# Altium footprint library aiskylab-01Resistors.PcbLib: 208 footprints (part 2 of 13)
Each footprint in its own frame and in the unit in brackets; x right, y up, seen from the top. Pads: shape width x height; smd on the part's side, far side on the other; paste and mask are expansions set on the pad; w line width, h text height; cw(c..) or ccw(c..) is an arc to the next point about the centre after c.
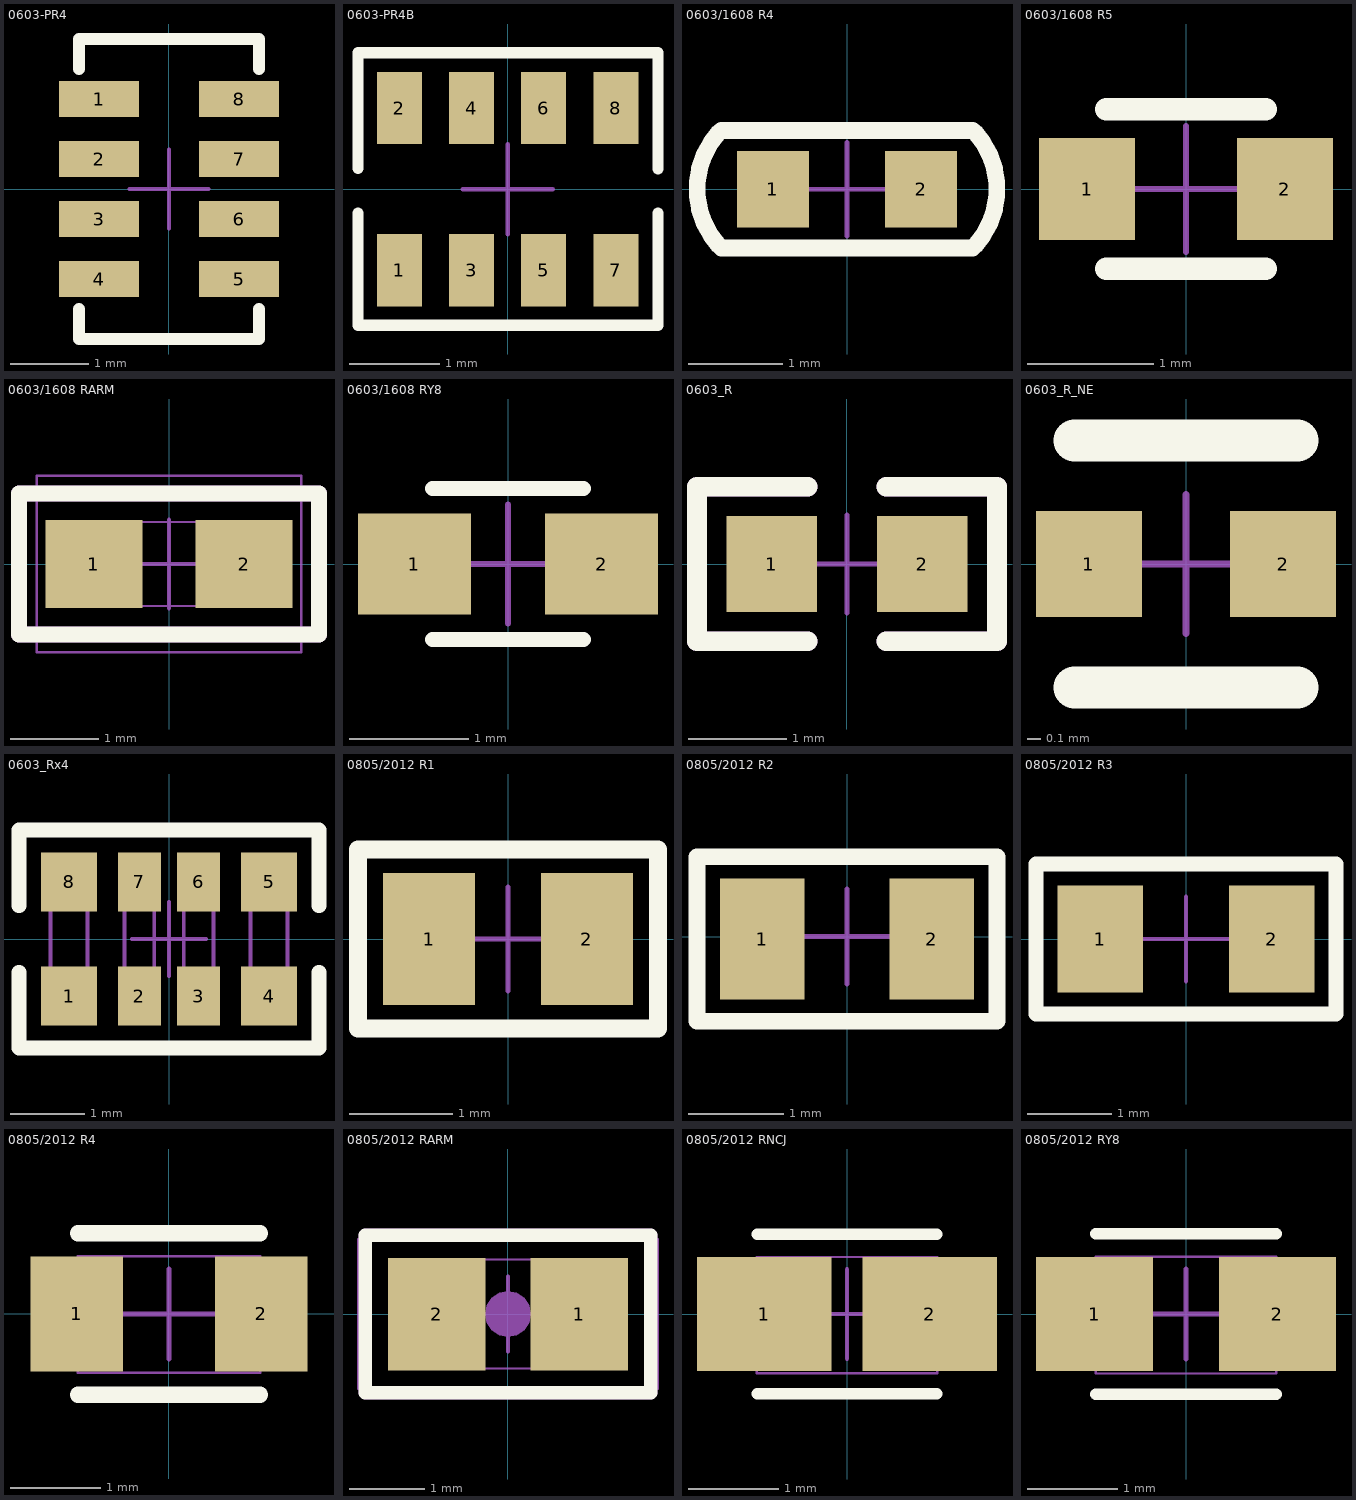
[diagram p1: the footprints below, top view; thin cyan lines are the x and y axes]

## 0603-PR4 [mil]
height 649.61
pads (8):
  rect 40x18 smd mask+2.76: 1(-35,45) 2(-35,15) 3(-35,-15) 5(35,-45) 6(35,-15) 7(35,15) 8(35,45)
  rect 40x18 smd: 4(-35,-45)
Top Overlay:
  lines w6: -45,-60 -45,-75 45,-75 45,-60 ; -45,60 -45,75 45,75 45,60
Top Designator:
  text ".Designator" at -300.52,-19.99 h60
Top Component Center:
  lines w1.97: -19.68,0 19.68,0 ; 0,-19.68 0,19.68
3D body "0_4572-1_016.stp": height 0.79, standoff 0, extent 15.01,36.01 55.01,54.01
3D body "0_4572-1_016.stp": height 0.79, standoff 0, extent 15.01,6.01 55.01,24
3D body "0_4572-1_016.stp": height 0.79, standoff 0, extent 15,-23.99 55,-5.99
3D body "0_4572-1_016.stp": height 0.79, standoff 0, extent 15.01,-53.99 55.01,-36
3D body "cay16-j2.stp": height 20.28, standoff 0, extent -31.49,-63 31.5,62.99
3D body "0_4572-1_016.stp": height 0.79, standoff 0, extent -54.99,-53.99 -14.99,-35.99
3D body "0_4572-1_016.stp": height 0.79, standoff 0, extent -54.99,-23.99 -14.99,-6
3D body "0_4572-1_016.stp": height 0.79, standoff 0, extent -54.99,6.01 -14.99,24
3D body "0_4572-1_016.stp": height 0.79, standoff 0, extent -55,36.01 -15,54.01

## 0603-PR4B [mm]
height 16.5
pads (8):
  rect 0.5x0.8 smd: 1(-1.2,-0.9) 2(-1.2,0.9) 3(-0.4,-0.9) 4(-0.4,0.9) 5(0.4,-0.9) 6(0.4,0.9) 7(1.2,-0.9) 8(1.2,0.9)
Top Overlay:
  lines w0.127: -1.66,-0.265 -1.66,-1.51 1.668,-1.51 1.668,-0.265 ; -1.66,0.232 -1.66,1.513 1.668,1.513 1.668,0.224
Top Designator:
  text ".Designator" at -7.613,-0.506 h1.52
Top Component Center:
  lines w0.05: -0.5,0 0.5,0 ; 0,-0.5 0,0.5
3D body "p080-050.stp": height 0.02, standoff 0, extent 0.95,-1.3 1.45,-0.5
3D body "p080-050.stp": height 0.02, standoff 0, extent 0.15,-1.3 0.65,-0.5
3D body "p080-050.stp": height 0.02, standoff 0, extent -0.65,-1.3 -0.15,-0.5
3D body "p080-050.stp": height 0.02, standoff 0, extent -1.45,-1.3 -0.95,-0.5
3D body "p080-050.stp": height 0.02, standoff 0, extent 0.95,0.5 1.45,1.3
3D body "p080-050.stp": height 0.02, standoff 0, extent 0.15,0.5 0.65,1.3
3D body "p080-050.stp": height 0.02, standoff 0, extent -0.65,0.5 -0.15,1.3
3D body "p080-050.stp": height 0.02, standoff 0, extent -1.45,0.5 -0.95,1.3
3D body "cay16-j2.stp": height 0.52, standoff 0, extent -1.6,-0.8 1.6,0.8

## 0603/1608 R4 [mil]
height 649.61
pads (2):
  rect 30x32 smd: 1(-31,0)
  rect 30x32 smd mask+2.76: 2(31,0)
Top Overlay:
  lines w7: -52.5,-24.61 52.5,-24.61 ; -52.5,24.61 52.5,24.61
  lines w7.01: -53.51,-23.77 cw(c-27.44,0.11) -53.51,24 ; 53.5,-23.77 ccw(c27.43,0.11) 53.5,24
Top Designator:
  text ".Designator" at -299.91,-19.99 h60
Top Component Center:
  lines w1.97: -19.68,0 19.68,0 ; 0,-19.68 0,19.68
3D body "0_8128-0_762-0603.stp": height 0.79, standoff 0, extent -46,-16 -16,16
3D body "0603-r.stp": height 15.94, standoff 0, extent -31.49,-15.74 31.5,15.75
3D body "0_8128-0_762-0603.stp": height 0.79, standoff 0, extent 16,-16 46,16

## 0603/1608 R5 [mil] "Vishay CRCW 0603,±1% ,0.1W,±100ppm/°C"
height 649.61
pads (2):
  rect 30x32 smd: 1(-31,0) 2(31,0)
Top Overlay:
  lines w7: -25,-25 25,-25 ; -25,25 25,25
Top Designator:
  text ".Designator" at -299.9,-19.99 h60
Top Component Center:
  lines w1.97: -19.68,0 19.68,0 ; 0,-19.68 0,19.68
3D body "0_8128-0_762-0603.stp": height 0.79, standoff 0, extent -45,-16 -15,16
3D body "0_8128-0_762-0603.stp": height 0.79, standoff 0, extent 16.5,-16 46.5,16
3D body "0603-r.stp": height 15.94, standoff 0, extent -31.49,-16 31.5,15.5

## 0603/1608 RARM [mm]
height 16.5
pads (2):
  rect 1.1x1 smd: 1(-0.85,0) 2(0.85,0)
Top Overlay:
  lines w0.18: -1.7,-0.8 -1.7,0.8 1.7,0.8 1.7,-0.8 -1.7,-0.8
Top Designator:
  text ".Designator" at -7.618,-0.508 h1.52
Top Assembly:
  lines w0.025: -1.5,-1 1.5,-1 1.5,1 -1.5,1 -1.5,-1 ; -0.875,-0.475 0.875,-0.475 0.875,0.475 -0.875,0.475 -0.875,-0.475
Top Component Center:
  lines w0.05: -0.5,0 0.5,0 ; 0,-0.5 0,0.5
Top Component Outline:
  lines w0.18: -1.7,-0.8 1.7,-0.8 1.7,0.8 -1.7,0.8 -1.7,-0.8
Fab Notes:
  text "2" at 1.05,0 h0.5
  text "1" at -0.65,0 h0.5
3D body "0603-armpad.stp": height 0, standoff 0, extent 0.3,-0.5 1.4,0.5
3D body "0603-armpad.stp": height 0, standoff 0, extent -1.4,-0.5 -0.3,0.5
3D body "0603-r.stp": height 0.41, standoff 0, extent -0.8,-0.406 0.8,0.394

## 0603/1608 RY8 [mm]
height 16.5
pads (2):
  rect 0.95x0.85 smd: 1(-0.787,0) 2(0.787,0)
Top Overlay:
  lines w0.127: -0.635,-0.635 0.635,-0.635 ; -0.635,0.635 0.635,0.635
Top Designator:
  text ".Designator" at -7.618,-0.508 h1.52
Top Component Center:
  lines w0.05: -0.5,0 0.5,0 ; 0,-0.5 0,0.5
3D body "0603-r.stp": height 0.41, standoff 0, extent -0.8,-0.406 0.8,0.394
3D body "0_8128-0_762-0603.stp": height 0.02, standoff 0, extent -1.194,-0.381 -0.381,0.381
3D body "0_8128-0_762-0603.stp": height 0.02, standoff 0, extent 0.381,-0.381 1.194,0.381

## 0603_R [mm]
pads (2):
  rect 0.93x0.98 smd: 1(-0.77,0) 2(0.77,0)
Top Overlay:
  lines w0.2: -0.4,-0.79 -1.535,-0.79 -1.535,0.79 -0.4,0.79 ; 0.4,-0.79 1.535,-0.79 1.535,0.79 0.4,0.79
Top Designator:
  text ".Designator" at -7.618,-0.508 h1.52
Top Assembly:
  lines w0.2: -0.4,-0.79 -1.535,-0.79 -1.535,0.79 -0.4,0.79 ; 0.4,-0.79 1.535,-0.79 1.535,0.79 0.4,0.79
Top Component Center:
  lines w0.05: -0.5,0 0.5,0 ; 0,-0.5 0,0.5
3D body "User Library-RES_1609-0603.STEP": height 0.56, standoff 0, extent -0.85,-0.4 0.85,0.4

## 0603_R_NE [mil]
height 649.61
pads (2):
  rect 30x30 smd mask+2.76: 1(-27.5,0)
  rect 30x30 smd: 2(27.5,0)
Top Overlay:
  lines w12: -31.5,-35 31.5,-35 ; -31.5,35 31.5,35
Top Designator:
  text ".Designator" at -299.28,-19.99 h60
Top Component Center:
  lines w1.97: -19.68,0 19.68,0 ; 0,-19.68 0,19.68
3D body "0_762-0_762.stp": height 0.79, standoff 0, extent 12.51,-14.99 42.51,15.01
3D body "0_762-0_762.stp": height 0.79, standoff 0, extent -42.49,-14.99 -12.49,15.01
3D body "0603-r.stp": height 15.94, standoff 0, extent -31.49,-15.74 31.5,15.75

## 0603_Rx4 [mm] "JLC"
pads (8):
  rect 0.75x0.8 smd mask+0.051: 1(-1.35,-0.77) 4(1.35,-0.77) 5(1.35,0.77) 8(-1.35,0.77)
  rect 0.58x0.8 smd mask+0.051: 2(-0.4,-0.77) 3(0.4,-0.77) 6(0.4,0.77) 7(-0.4,0.77)
Top Overlay:
  lines w0.2: -2.025,-0.45 -2.025,-1.47 2.025,-1.47 2.025,-0.45 ; -2.025,0.45 -2.025,1.47 2.025,1.47 2.025,0.45
Top Designator:
  text ".Designator" at -7.618,-0.508 h1.52
Top Component Center:
  lines w0.05: -0.5,0 0.5,0 ; 0,-0.5 0,0.5
Bottom Value:
  lines w0.05: -1.6,-0.8 -1.6,0.8 -1.1,0.8 -1.1,-0.8 -1.6,-0.8 ; -0.6,-0.8 -0.6,0.8 -0.2,0.8 -0.2,-0.8 -0.6,-0.8 ; 0.2,-0.8 0.2,0.8 0.6,0.8 0.6,-0.8 0.2,-0.8 ; 1.1,-0.8 1.1,0.8 1.6,0.8 1.6,-0.8 1.1,-0.8
3D body "SW3dPS-RN164P.STEP": height 0.55, standoff 0, extent -1.6,-0.8 1.6,0.8

## 0805/2012 R1 [mil]
height 649.61
pads (2):
  rect 35x50 smd: 1(-30,0)
  rect 35x50 smd mask+2.76: 2(30,0)
Top Overlay:
  lines w7: -57,-34 -57,34 57,34 57,-34 1,-34 -57,-34
Top Designator:
  text ".Designator" at -299.9,-19.99 h60
Top Component Center:
  lines w1.97: -19.68,0 19.68,0 ; 0,-19.68 0,19.68
3D body "0805_1016_127.stp": height 0.39, standoff 0, extent 7.5,-25 47.5,25
3D body "0805-r.stp": height 19.88, standoff 0, extent -39.5,-25 39.24,24.21
3D body "0805_1016_127.stp": height 0.39, standoff 0, extent -47.5,-25 -7.5,25

## 0805/2012 R2 [mil]
height 649.61
pads (2):
  rect 35x50 smd: 1(-35,-1)
  rect 35x50 smd mask+2.76: 2(35,-1)
Top Overlay:
  lines w7: -62,-35 -62,33 62,33 62,-35 1,-35 -62,-35
Top Designator:
  text ".Designator" at -299.9,-20.99 h60
Top Component Center:
  lines w1.97: -19.68,0 19.68,0 ; 0,-19.68 0,19.68
3D body "0805_1016_127.stp": height 0.39, standoff 0, extent 12.5,-26 52.5,23.99
3D body "0805-r.stp": height 19.88, standoff 0, extent -39.5,-25 39.24,24.21
3D body "0805_1016_127.stp": height 0.39, standoff 0, extent -52.5,-25.99 -12.5,24

## 0805/2012 R3 [mil]
height 649.61
pads (2):
  rect 40x50 smd: 1(-40,0)
  rect 40x50 smd mask+2.76: 2(40,0)
Top Overlay:
  lines w7: -70,-35 0,-35 70,-35 70,35 -70,35 -70,-35
Top Designator:
  text ".Designator" at -299.9,-19.99 h60
Top Component Center:
  lines w1.97: -19.68,0 19.68,0 ; 0,-19.68 0,19.68
3D body "0805-r.stp": height 19.88, standoff 0, extent -39.5,-25 39.24,24.21
3D body "0805_1016_127.stp": height 0.39, standoff 0, extent -60,-25 -20,25
3D body "0805_1016_127.stp": height 0.39, standoff 0, extent 20,-25 60,25

## 0805/2012 R4 [mil]
height 649.61
pads (2):
  rect 40x50 smd: 1(-40,0)
  rect 40x50 smd mask+2.76: 2(40,0)
Top Overlay:
  lines w7: -39.37,-35 39.37,-35 ; -39.37,35 39.37,35
Top Designator:
  text ".Designator" at -300.52,-19.99 h60
Top Component Center:
  lines w1.97: -19.68,0 19.68,0 ; 0,-19.68 0,19.68
Bottom 3D Body:
  lines w1: -39.5,-25.5 -39.5,25 39.5,25 39.5,-25.5 -39.5,-25.5
3D body "0805_1016_127.stp": height 0.39, standoff 0, extent 20,-25 60,25
3D body "0805-r.stp": height 19.88, standoff 0, extent -39.5,-25 39.24,24.21
3D body "0805_1016_127.stp": height 0.39, standoff 0, extent -60,-25 -20,25

## 0805/2012 RARM [mm]
height 16.5
pads (2):
  rect 1.3x1.5 smd: 1(0.95,0) 2(-0.95,0)
Top Overlay:
  lines w0.18: -1.9,-1.05 1.9,-1.05 1.9,1.05 -1.9,1.05 -1.9,-1.05
Top Designator:
  text ".Designator" at -7.618,-0.508 h1.52
Top Assembly:
  pour cut-out: 0.306,0 0.283,-0.117 0.216,-0.216 0.117,-0.283 0,-0.306 -0.117,-0.283 -0.216,-0.216 -0.283,-0.117 -0.306,0 -0.283,0.117 -0.216,0.216 -0.117,0.283 0,0.306 0.117,0.283 0.216,0.216 0.283,0.117
  lines w0.025: -2,-1 -2,1 2,1 2,-1 -2,-1 ; -1.1,-0.725 -1.1,0.725 1.1,0.725 1.1,-0.725 -1.1,-0.725
Top Component Center:
  lines w0.05: -0.5,0 0.5,0 ; 0,-0.5 0,0.5
Bottom Component Center:
  lines w0.18: -1.9,-1.05 1.9,-1.05 1.9,1.05 -1.9,1.05 -1.9,-1.05
Fab Notes:
  text "1" at 0.75,0 h0.5
  text "2" at -1.15,0 h0.5
3D body "0805-r.stp": height 0.51, standoff 0, extent -1.003,-0.635 0.997,0.615
3D body "0805-arm.stp": height 0, standoff 0, extent -1.6,-0.75 -0.3,0.75
3D body "0805-arm.stp": height 0, standoff 0, extent 0.3,-0.75 1.6,0.75

## 0805/2012 RNCJ [mm]
height 16.5
pads (2):
  rect 1.5x1.27 smd: 1(-0.92,0)
  rect 1.5x1.27 smd mask+0.07: 2(0.92,0)
Top Overlay:
  lines w0.127: -1,-0.889 1,-0.889 ; -1,0.889 1,0.889
Top Designator:
  text ".Designator" at -7.633,-0.508 h1.52
Top Component Center:
  lines w0.05: -0.5,0 0.5,0 ; 0,-0.5 0,0.5
Bottom 3D Body:
  lines w0.025: -1.003,-0.66 1.003,-0.66 1.003,0.635 -1.003,0.635 -1.003,-0.66
3D body "0805_1016_127.stp": height 0.01, standoff 0, extent -1.676,-0.635 -0.66,0.635
3D body "0805-r.stp": height 0.51, standoff 0, extent -1.003,-0.635 0.997,0.615
3D body "0805_1016_127.stp": height 0.01, standoff 0, extent 0.635,-0.635 1.651,0.635

## 0805/2012 RY8 [mm]
height 16.5
pads (2):
  rect 1.3x1.27 smd: 1(-1.016,0)
  rect 1.3x1.27 smd mask+0.07: 2(1.016,0)
Top Overlay:
  lines w0.127: -1,-0.889 1,-0.889 ; -1,0.889 1,0.889
Top Designator:
  text ".Designator" at -7.633,-0.508 h1.52
Top Component Center:
  lines w0.05: -0.5,0 0.5,0 ; 0,-0.5 0,0.5
Bottom 3D Body:
  lines w0.025: -1.003,-0.66 1.003,-0.66 1.003,0.635 -1.003,0.635 -1.003,-0.66
3D body "0805_1016_127.stp": height 0.01, standoff 0, extent 0.635,-0.635 1.651,0.635
3D body "0805-r.stp": height 0.51, standoff 0, extent -1.003,-0.635 0.997,0.615
3D body "0805_1016_127.stp": height 0.01, standoff 0, extent -1.676,-0.635 -0.66,0.635